# Altium footprint library General.PcbLib: 128 footprints (part 3 of 8)
Each footprint in its own frame and in the unit in brackets; x right, y up, seen from the top. Pads: shape width x height; smd on the part's side, far side on the other; paste and mask are expansions set on the pad; w line width, h text height; cw(c..) or ccw(c..) is an arc to the next point about the centre after c.
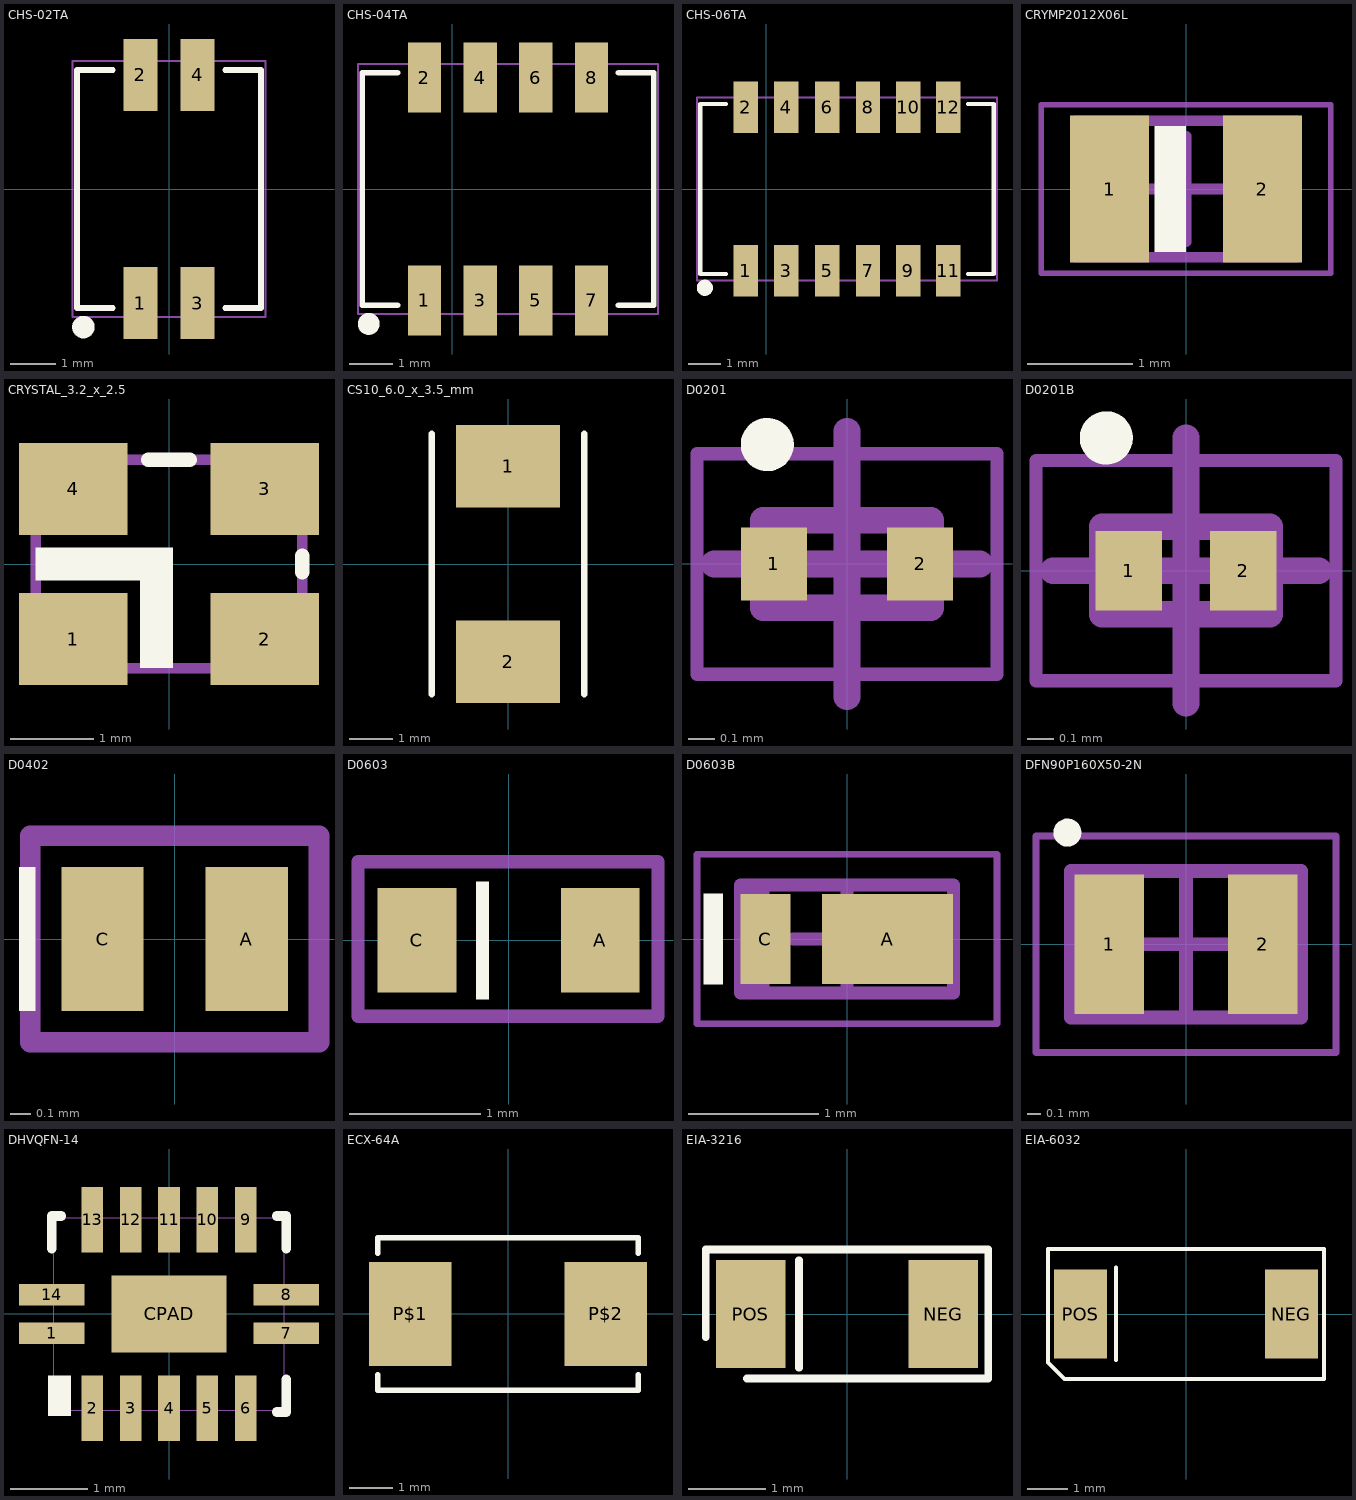
[diagram p2: the footprints below, top view; thin cyan lines are the x and y axes]

## CHS-02TA [mm] "SWITCH SLIDE DIP SPST 100MA 6V"
pads (4):
  rect 0.76x1.6 smd: 1(-0.635,-2.54) 2(-0.635,2.54) 3(0.635,-2.54) 4(0.635,2.54)
Top Overlay:
  circle w0.25: c-1.905,-3.075 r0.125
  lines w0.127: -1.25,-2.65 -2.05,-2.65 -2.05,2.65 -1.25,2.65 ; 1.25,-2.65 2.05,-2.65 2.05,2.65 1.25,2.65
Mechanical 15:
  lines w0.05: -2.15,-2.85 2.15,-2.85 2.15,2.85 -2.15,2.85 -2.15,-2.85
3D body "CHS-02TA.stp": height 2.52, standoff 0, extent -2.05,-2.8 2.05,2.8

## CHS-04TA [mm] "SWITCH SLIDE DIP SPST 100MA 6V"
pads (8):
  rect 0.76x1.6 smd: 1(-0.635,-2.54) 2(-0.635,2.54) 3(0.635,-2.54) 4(0.635,2.54) 5(1.905,-2.54) 6(1.905,2.54) 7(3.175,-2.54) 8(3.175,2.54)
Top Overlay:
  circle w0.25: c-1.905,-3.075 r0.125
  lines w0.127: -1.25,-2.65 -2.05,-2.65 -2.05,2.65 -1.25,2.65 ; 3.79,-2.65 4.59,-2.65 4.59,2.65 3.79,2.65
Mechanical 15:
  lines w0.05: -2.15,-2.85 -2.15,2.85 4.69,2.85 4.69,-2.85 -2.15,-2.85
3D body "CHS-04TA.stp": height 2.52, standoff 0, extent -2.02,-2.8 4.58,2.8

## CHS-06TA [mm] "SWITCH SLIDE DIP SPST 100MA 6V"
pads (12):
  rect 0.76x1.6 smd: 1(-0.635,-2.54) 2(-0.635,2.54) 3(0.635,-2.54) 4(0.635,2.54) 5(1.905,-2.54) 6(1.905,2.54) 7(3.175,-2.54) 8(3.175,2.54) 9(4.425,-2.54) 10(4.425,2.54) 11(5.675,-2.54) 12(5.675,2.54)
Top Overlay:
  circle w0.25: c-1.905,-3.075 r0.125
  lines w0.127: -1.25,-2.65 -2.05,-2.65 -2.05,2.65 -1.25,2.65 ; 6.29,-2.65 7.09,-2.65 7.09,2.65 6.29,2.65
Mechanical 15:
  lines w0.05: -2.15,-2.85 7.19,-2.85 7.19,2.85 -2.15,2.85 -2.15,-2.85
3D body "CHS-06TA.stp": height 2.42, standoff -0.1, extent -2.1,-2.8 7.1,2.8

## CRYMP2012X06L [mm] "Molded Crystal, 2-Leads, Body 2.00x1.20mm, IPC High Density"
height 0.6
pads (2):
  rect 0.75x1.4 smd: 1(-0.725,0) 2(0.725,0)
Top Overlay:
  rectangle: -0.3,-0.6 0,0.6
Mechanical 13:
  rectangle: -1.05,-0.65 -0.768,0.65
  lines w0.1: -1.05,-0.65 -1.05,0.65 1.05,0.65 1.05,-0.65 -1.05,-0.65
Mechanical 15:
  lines w0.05: -1.375,-0.8 -1.375,0.8 1.375,0.8 1.375,-0.8 -1.375,-0.8
  lines w0.1: -0.5,0 0.5,0 ; 0,-0.5 0,0.5
3D body: height 0.6, standoff 0, extent -1.05,-0.65 1.05,0.65

## CRYSTAL_3.2_x_2.5 [mm]
height 0.8
pads (4):
  rect 1.3x1.1 smd: 1(-1.15,-0.9) 2(1.15,-0.9) 3(1.15,0.9) 4(-1.15,0.9)
Top Overlay:
  rectangle: -0.35,-1.25 0.05,0.1
  region: 0.05,-0.2 0.05,0.2 -1.6,0.2 -1.6,-0.2
  lines w0.178: -0.25,1.25 0.25,1.25 ; 1.6,-0.1 1.6,0.1
Mechanical 13:
  lines w0.127: -1.6,-1.25 -1.6,1.25 1.6,1.25 1.6,-1.25 -1.6,-1.25
3D body: height 0.8, standoff 0, extent -1.599,-1.249 1.599,1.249

## CS10_6.0_x_3.5_mm [mm]
height 1.2
pads (2):
  rect 2.4x1.9 smd: 1(0,2.25) 2(0,-2.25)
Top Overlay:
  lines w0.152: -1.75,-3 -1.75,3 ; 1.75,-3 1.75,3

## D0201 [mm]
height 0.32
pads (2):
  rect 0.25x0.275 smd: 1(-0.275,0) 2(0.275,0)
Top Overlay:
  circle w0.1: c-0.3,0.45 r0.05
Mechanical 13:
  lines w0.1: -0.315,-0.165 0.315,-0.165 0.315,0.165 -0.315,0.165 -0.315,-0.165
Mechanical 15:
  lines w0.05: -0.565,-0.415 0.565,-0.415 0.565,0.415 -0.565,0.415 -0.565,-0.415
  lines w0.1: -0.5,0 0.5,0 ; 0,-0.5 0,0.5
3D body: height 0.32, standoff 0, extent -0.315,-0.165 0.315,0.165

## D0201B [mm] "DFN, 2-Leads, Body 0.30x0.60mm, Pitch 0.35mm, IPC Medium Density"
height 0.32
pads (2):
  rect 0.25x0.3 smd: 1(-0.215,0) 2(0.215,0)
Top Overlay:
  circle w0.1: c-0.3,0.5 r0.05
Mechanical 13:
  lines w0.1: -0.315,-0.165 0.315,-0.165 0.315,0.165 -0.315,0.165 -0.315,-0.165
Mechanical 15:
  lines w0.05: -0.565,-0.415 0.565,-0.415 0.565,0.415 -0.565,0.415 -0.565,-0.415
  lines w0.1: -0.5,0 0.5,0 ; 0,-0.5 0,0.5
3D body: height 0.32, standoff 0, extent -0.315,-0.165 0.315,0.165

## D0402 [mm]
pads (2):
  rect 0.4x0.7 smd: A(0.35,0) C(-0.35,0)
Top Overlay:
  rectangle: -0.755,-0.35 -0.675,0.35
Mechanical 15:
  lines w0.1: -0.7,-0.5 0.7,-0.5 0.7,0.5 -0.7,0.5 -0.7,-0.5
3D body "User Library-CDBQ0230L.STEP": height 0.56, standoff 0, extent -0.546,-0.33 0.546,0.33

## D0603 [mm]
pads (2):
  rect 0.6x0.8 smd: A(0.7,0) C(-0.7,0)
Top Overlay:
  rectangle: -0.25,-0.45 -0.15,0.45
Mechanical 15:
  lines w0.1: -1.15,-0.58 1.14,-0.58 1.14,-0.14 1.14,0.6 -1.15,0.6 -1.15,0.15 -1.15,-0.35 -1.15,-0.58
3D body "User Library-CDSU101A.STEP": height 0.85, standoff 0, extent -0.9,-0.5 0.9,0.5

## D0603B [mm] "Molded Diode, 2-Leads, Body 1.60x0.80mm, IPC Medium Density"
height 0.3
pads (2):
  rect 1.005x0.69 smd: A(0.312,0)
  rect 0.385x0.69 smd: C(-0.625,0)
Top Overlay:
  rectangle: -1.1,-0.35 -0.95,0.35
Mechanical 13:
  rectangle: -0.815,-0.415 -0.596,0.415
  lines w0.1: -0.815,-0.415 -0.815,0.415 0.815,0.415 0.815,-0.415 -0.815,-0.415
Mechanical 15:
  lines w0.05: -1.15,-0.65 -1.15,0.65 1.15,0.65 1.15,-0.65 -1.15,-0.65
  lines w0.1: -0.415,0 0.415,0 ; 0,-0.415 0,0.415
3D body "DIOM1608X03N.step": height 0.45, standoff 0, extent -0.86,-0.415 0.86,0.415

## DFN90P160X50-2N [mm] "DFN, 2-Leads, Body 1.00x1.60mm, Pitch 0.90mm, IPC Medium Density"
height 0.5
pads (2):
  rect 0.5x1 smd: 1(-0.55,0) 2(0.55,0)
Top Overlay:
  circle w0.1: c-0.85,0.8 r0.05
Mechanical 13:
  lines w0.1: -0.825,-0.525 -0.825,0.525 0.825,0.525 0.825,-0.525 -0.825,-0.525
Mechanical 15:
  lines w0.05: -1.075,-0.775 -1.075,0.775 1.075,0.775 1.075,-0.775 -1.075,-0.775
  lines w0.1: -0.5,0 0.5,0 ; 0,-0.5 0,0.5
3D body "DFN90P160X50-2N.step": height 0.5, standoff 0, extent -0.825,-0.525 0.825,0.525

## DHVQFN-14 [mm]
pads (15):
  rect 0.85x0.28 smd: 1(-1.525,-0.25) 7(1.525,-0.25) 8(1.525,0.25) 14(-1.525,0.25)
  rect 0.28x0.85 smd: 2(-1,-1.225) 3(-0.5,-1.225) 4(0,-1.225) 5(0.5,-1.225) 6(1,-1.225) 9(1,1.225) 10(0.5,1.225) 11(0,1.225) 12(-0.5,1.225) 13(-1,1.225)
  rect 1.5x1 smd paste-0.25: CPAD(0,0)
Top Overlay:
  rectangle: -1.575,-1.325 -1.275,-0.8
  lines w0.127: -1.525,0.85 -1.525,1.275 -1.4,1.275 ; 1.4,-1.275 1.525,-1.275 1.525,-0.85 ; 1.4,1.275 1.525,1.275 1.525,0.85
Mechanical 1:
  lines w0: -1.5,-1.25 1.5,-1.25 1.5,1.25 -1.5,1.25 -1.5,-1.25
3D body: height 1, standoff 0, extent -1.5,-1.25 1.5,1.25

## ECX-64A [mm]
pads (2):
  rect 1.9x2.4 smd: P$1(-2.25,0) P$2(2.25,0)
Top Overlay:
  lines w0.127: -3,-1.4 -3,-1.75 3,-1.75 3,-1.4 ; -3,1.4 -3,1.75 3,1.75 3,1.4
3D body: height 1, standoff 0, extent -3.063,-1.814 3.063,1.814

## EIA-3216 [mm] "EIA-A"
pads (2):
  rect 0.9x1.4 smd: NEG(1.25,0) POS(-1.25,0)
Top Overlay:
  lines w0.1: -1.838,-0.3 -1.838,0.838 1.838,0.838 1.838,-0.838 -1.3,-0.838 ; -0.625,-0.7 -0.625,0.7
3D body "User Library-cap3216h160.step": height 1.6, standoff 0, extent -1.6,-0.8 1.6,0.8

## EIA-6032 [mm] "EIA-C"
pads (2):
  rect 1.3x2.2 smd: NEG(2.6,0) POS(-2.6,0)
Top Overlay:
  lines w0.1: -3.4,1.6 3.4,1.6 3.4,-1.6 ; -1.724,-1.135 -1.724,1.143
  lines w0.102: -3.4,1.6 -3.4,-1.194 -3.019,-1.575 ; -2.994,-1.6 3.4,-1.6
3D body "User Library-cap_c.step": height 2.51, standoff 0, extent -2.997,-1.55 2.997,1.65